# Altium integrated library Altium_WE-VD (rev23a).IntLib: 78 symbols
Pins are listed as number, name and electrical type; pins without a type are passive.

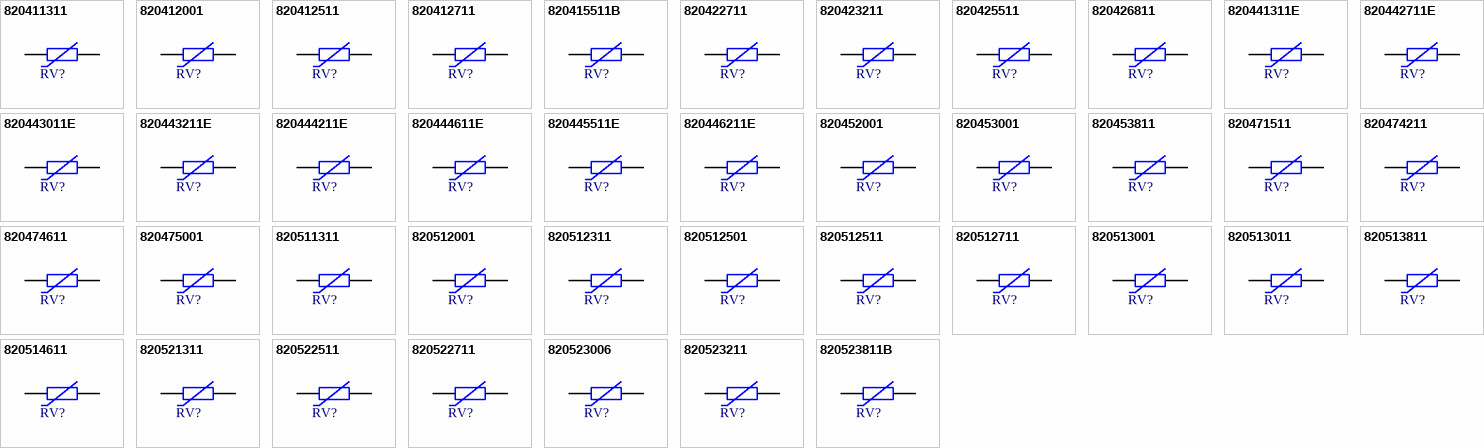
[diagram p0: symbols 820411311 to 820523811B]

## 820411311
designator RV?, comment 130VAC, 170VDC  (value not drawn)
WE-VD Disk Varistor, THT, 130VAC, 170VDC, 410pF; Manufacturer Part Number: 820411311; Manufacturer: Wurth Elektronik; Clamping Voltage: 340V; Energy Absorption: 35J; Operating Voltage (AC): 130V; Operating Voltage (DC): 170V; Pitch: 0.8mm; Power Dissipation: 0.4W; (Reverse) Breakdown Voltage: 200V; (Reverse) Peak Pulse Current: 3500A; Category: Surge Protection; Match Code: WE-VD; ComponentLink1Description: Website Link; ComponentLink1URL: https://www.we-online.com/redexpert/article/820411311?ad; ComponentLink2Description: Datasheet Link; ComponentLink2URL: https://www.we-online.com/redexpert/spec/820411311?ad; Mount: Through Hole; Operating Temperature Max: 85°C; Operating Temperature Min: -40°C; Packaging: Tape and Reel; Width: 4.6mm; Height: 15.5mm; Diameter: 12.5mm; Channel Input Capacitance: 410pF
footprint D12.5W4.6H15.5P0.8
pins: 1, 2

## 820412001
designator RV?, comment 20VAC, 26VDC  (value not drawn)
WE-VD Disk Varistor, THT, 20VAC, 26VDC, 4250pF; Manufacturer Part Number: 820412001; Manufacturer: Wurth Elektronik; Clamping Voltage: 65V; Energy Absorption: 4.8J; Operating Voltage (AC): 20V; Operating Voltage (DC): 26V; Pitch: 0.8mm; Power Dissipation: 0.05W; (Reverse) Breakdown Voltage: 33V; (Reverse) Peak Pulse Current: 1000A; Category: Surge Protection; Match Code: WE-VD; ComponentLink1Description: Website Link; ComponentLink1URL: https://www.we-online.com/redexpert/article/820412001?ad; ComponentLink2Description: Datasheet Link; ComponentLink2URL: https://www.we-online.com/redexpert/spec/820412001?ad; Mount: Through Hole; Operating Temperature Max: 85°C; Operating Temperature Min: -40°C; Packaging: Tape and Reel; Width: 5.1mm; Height: 15.5mm; Diameter: 12.5mm; Channel Input Capacitance: 4250pF
footprint D12.5W5.1H15.5P0.8
pins: 1, 2

## 820412511
designator RV?, comment 250VAC, 320VDC  (value not drawn)
WE-VD Disk Varistor, THT, 250VAC, 320VDC, 210pF; Manufacturer Part Number: 820412511; Manufacturer: Wurth Elektronik; Clamping Voltage: 650V; Energy Absorption: 70J; Operating Voltage (AC): 250V; Operating Voltage (DC): 320V; Pitch: 1.1mm; Power Dissipation: 0.4W; (Reverse) Breakdown Voltage: 390V; (Reverse) Peak Pulse Current: 3500A; Category: Surge Protection; Match Code: WE-VD; ComponentLink1Description: Website Link; ComponentLink1URL: https://www.we-online.com/redexpert/article/820412511?ad; ComponentLink2Description: Datasheet Link; ComponentLink2URL: https://www.we-online.com/redexpert/spec/820412511?ad; Mount: Through Hole; Operating Temperature Max: 85°C; Operating Temperature Min: -40°C; Packaging: Tape and Reel; Width: 5.7mm; Height: 16mm; Diameter: 12.5mm; Channel Input Capacitance: 210pF
footprint D12.5W5.7H16P1.1
pins: 1, 2

## 820412711
designator RV?, comment 275VAC, 350VDC  (value not drawn)
WE-VD Disk Varistor, THT, 275VAC, 350VDC, 190pF; Manufacturer Part Number: 820412711; Manufacturer: Wurth Elektronik; Clamping Voltage: 710V; Energy Absorption: 80J; Operating Voltage (AC): 275V; Operating Voltage (DC): 350V; Pitch: 1.3mm; Power Dissipation: 0.4W; (Reverse) Breakdown Voltage: 430V; (Reverse) Peak Pulse Current: 3500A; Category: Surge Protection; Match Code: WE-VD; ComponentLink1Description: Website Link; ComponentLink1URL: https://www.we-online.com/redexpert/article/820412711?ad; ComponentLink2Description: Datasheet Link; ComponentLink2URL: https://www.we-online.com/redexpert/spec/820412711?ad; Mount: Through Hole; Operating Temperature Max: 85°C; Operating Temperature Min: -40°C; Packaging: Tape and Reel; Width: 6.5mm; Height: 16mm; Diameter: 12.5mm; Channel Input Capacitance: 190pF
footprint D12.5W6.5H16P1.3
pins: 1, 2

## 820415511B
designator RV?, comment 550VAC, 745VDC  (value not drawn)
WE-VD Disk Varistor, THT, 550VAC, 745VDC, 95pF; Manufacturer Part Number: 820415511B; Manufacturer: Wurth Elektronik; Clamping Voltage: 1500V; Energy Absorption: 127J; Operating Voltage (AC): 550V; Operating Voltage (DC): 745V; Pitch: 3.6mm; Power Dissipation: 0.4W; (Reverse) Breakdown Voltage: 910V; (Reverse) Peak Pulse Current: 3500A; Category: Surge Protection; Match Code: WE-VD; ComponentLink1Description: Website Link; ComponentLink1URL: https://www.we-online.com/redexpert/article/820415511B?ad; ComponentLink2Description: Datasheet Link; ComponentLink2URL: https://www.we-online.com/redexpert/spec/820415511B?ad; Mount: Through Hole; Operating Temperature Max: 85°C; Operating Temperature Min: -40°C; Packaging: Tape and Reel; Width: 9.4mm; Height: 16.5mm; Diameter: 12.5mm; Channel Input Capacitance: 95pF
footprint D12.5W9.4H16.5P3.6
pins: 1, 2

## 820422711
designator RV?, comment 275VAC, 350VDC  (value not drawn)
WE-VD Disk Varistor, THT, 275VAC, 350VDC, 860pF; Manufacturer Part Number: 820422711; Manufacturer: Wurth Elektronik; Clamping Voltage: 710V; Energy Absorption: 303J; Operating Voltage (AC): 275V; Operating Voltage (DC): 350V; Pitch: 1.1mm; Power Dissipation: 1W; (Reverse) Breakdown Voltage: 430V; (Reverse) Peak Pulse Current: 10000A; Category: Surge Protection; Match Code: WE-VD; ComponentLink1Description: Website Link; ComponentLink1URL: https://www.we-online.com/redexpert/article/820422711?ad; ComponentLink2Description: Datasheet Link; ComponentLink2URL: https://www.we-online.com/redexpert/spec/820422711?ad; Mount: Through Hole; Operating Temperature Max: 85°C; Operating Temperature Min: -40°C; Packaging: Tape and Reel; Width: 7.2mm; Height: 26.5mm; Diameter: 23mm; Channel Input Capacitance: 860pF
footprint D23W7.2H26.5P1.1
pins: 1, 2

## 820423211
designator RV?, comment 320VAC, 418VDC  (value not drawn)
WE-VD Disk Varistor, THT, 320VAC, 418VDC, 760pF; Manufacturer Part Number: 820423211; Manufacturer: Wurth Elektronik; Clamping Voltage: 842V; Energy Absorption: 382J; Operating Voltage (AC): 320V; Operating Voltage (DC): 418V; Pitch: 1.5mm; Power Dissipation: 1W; (Reverse) Breakdown Voltage: 510V; (Reverse) Peak Pulse Current: 10000A; Category: Surge Protection; Match Code: WE-VD; ComponentLink1Description: Website Link; ComponentLink1URL: https://www.we-online.com/redexpert/article/820423211?ad; ComponentLink2Description: Datasheet Link; ComponentLink2URL: https://www.we-online.com/redexpert/spec/820423211?ad; Mount: Through Hole; Operating Temperature Max: 85°C; Operating Temperature Min: -40°C; Packaging: Tape and Reel; Width: 7.7mm; Height: 27mm; Diameter: 23mm; Channel Input Capacitance: 760pF
footprint D23W7.7H27P1.5
pins: 1, 2

## 820425511
designator RV?, comment 550VAC, 7454VDC  (value not drawn)
WE-VD Disk Varistor, THT, 550VAC, 7454VDC, 430pF; Manufacturer Part Number: 820425511; Manufacturer: Wurth Elektronik; Clamping Voltage: 1500V; Energy Absorption: 510J; Operating Voltage (AC): 550V; Operating Voltage (DC): 7454V; Pitch: 3.4mm; Power Dissipation: 1W; (Reverse) Breakdown Voltage: 910V; (Reverse) Peak Pulse Current: 10000A; Category: Surge Protection; Match Code: WE-VD; ComponentLink1Description: Website Link; ComponentLink1URL: https://www.we-online.com/redexpert/article/820425511?ad; ComponentLink2Description: Datasheet Link; ComponentLink2URL: https://www.we-online.com/redexpert/spec/820425511?ad; Mount: Through Hole; Operating Temperature Max: 85°C; Operating Temperature Min: -40°C; Packaging: Tape and Reel; Width: 10.1mm; Height: 27mm; Diameter: 23mm; Channel Input Capacitance: 430pF
footprint D23W10.1H27P3.4
pins: 1, 2

## 820426811
designator RV?, comment 680VAC, 895VDC  (value not drawn)
WE-VD Disk Varistor, THT, 680VAC, 895VDC, 360pF; Manufacturer Part Number: 820426811; Manufacturer: Wurth Elektronik; Clamping Voltage: 1815V; Energy Absorption: 620J; Operating Voltage (AC): 680V; Operating Voltage (DC): 895V; Pitch: 4.3mm; Power Dissipation: 1W; (Reverse) Breakdown Voltage: 1100V; (Reverse) Peak Pulse Current: 10000A; Category: Surge Protection; Match Code: WE-VD; ComponentLink1Description: Website Link; ComponentLink1URL: https://www.we-online.com/redexpert/article/820426811?ad; ComponentLink2Description: Datasheet Link; ComponentLink2URL: https://www.we-online.com/redexpert/spec/820426811?ad; Mount: Through Hole; Operating Temperature Max: 85°C; Operating Temperature Min: -40°C; Packaging: Tape and Reel; Width: 11.2mm; Height: 27mm; Diameter: 23mm; Channel Input Capacitance: 360pF
footprint D23W11.2H27P4.3
pins: 1, 2

## 820441311E
designator RV?, comment 130VAC, 170VDC  (value not drawn)
WE-VD Disk Varistor, THT, 130VAC, 170VDC, 840pF; Manufacturer Part Number: 820441311E; Manufacturer: Wurth Elektronik; Clamping Voltage: 340V; Energy Absorption: 70J; Operating Voltage (AC): 130V; Operating Voltage (DC): 170V; Pitch: 0.8mm; Power Dissipation: 0.6W; (Reverse) Breakdown Voltage: 200V; (Reverse) Peak Pulse Current: 6000A; Category: Surge Protection; Match Code: WE-VD; ComponentLink1Description: Website Link; ComponentLink1URL: https://www.we-online.com/redexpert/article/820441311E?ad; ComponentLink2Description: Datasheet Link; ComponentLink2URL: https://www.we-online.com/redexpert/spec/820441311E?ad; Mount: Through Hole; Operating Temperature Max: 85°C; Operating Temperature Min: -40°C; Packaging: Tape and Reel; Width: 4.8mm; Height: 19.5mm; Diameter: 16.5mm; Channel Input Capacitance: 840pF
footprint D16.5W4.8H19.5P0.8
pins: 1, 2

## 820442711E
designator RV?, comment 275VAC, 350VDC  (value not drawn)
WE-VD Disk Varistor, THT, 275VAC, 350VDC, 450pF; Manufacturer Part Number: 820442711E; Manufacturer: Wurth Elektronik; Clamping Voltage: 710V; Energy Absorption: 155J; Operating Voltage (AC): 275V; Operating Voltage (DC): 350V; Pitch: 1.3mm; Power Dissipation: 0.6W; (Reverse) Breakdown Voltage: 430V; (Reverse) Peak Pulse Current: 6000A; Category: Surge Protection; Match Code: WE-VD; ComponentLink1Description: Website Link; ComponentLink1URL: https://www.we-online.com/redexpert/article/820442711E?ad; ComponentLink2Description: Datasheet Link; ComponentLink2URL: https://www.we-online.com/redexpert/spec/820442711E?ad; Mount: Through Hole; Operating Temperature Max: 85°C; Operating Temperature Min: -40°C; Packaging: Tape and Reel; Width: 6.7mm; Height: 20mm; Diameter: 16.5mm; Channel Input Capacitance: 450pF
footprint D16.5W6.7H20P1.3
pins: 1, 2

## 820443011E
designator RV?, comment 300VAC, 385VDC  (value not drawn)
WE-VD Disk Varistor, THT, 300VAC, 385VDC, 420pF; Manufacturer Part Number: 820443011E; Manufacturer: Wurth Elektronik; Clamping Voltage: 775V; Energy Absorption: 175J; Operating Voltage (AC): 300V; Operating Voltage (DC): 385V; Pitch: 1.5mm; Power Dissipation: 0.6W; (Reverse) Breakdown Voltage: 470V; (Reverse) Peak Pulse Current: 6000A; Category: Surge Protection; Match Code: WE-VD; ComponentLink1Description: Website Link; ComponentLink1URL: https://www.we-online.com/redexpert/article/820443011E?ad; ComponentLink2Description: Datasheet Link; ComponentLink2URL: https://www.we-online.com/redexpert/spec/820443011E?ad; Mount: Through Hole; Operating Temperature Max: 85°C; Operating Temperature Min: -40°C; Packaging: Tape and Reel; Width: 7mm; Height: 20mm; Diameter: 16.5mm; Channel Input Capacitance: 420pF
footprint D16.5W7H20P1.5
pins: 1, 2

## 820443211E
designator RV?, comment 320VAC, 418VDC  (value not drawn)
WE-VD Disk Varistor, THT, 320VAC, 418VDC, 370pF; Manufacturer Part Number: 820443211E; Manufacturer: Wurth Elektronik; Clamping Voltage: 842V; Energy Absorption: 190J; Operating Voltage (AC): 320V; Operating Voltage (DC): 418V; Pitch: 1.6mm; Power Dissipation: 0.6W; (Reverse) Breakdown Voltage: 510V; (Reverse) Peak Pulse Current: 6000A; Category: Surge Protection; Match Code: WE-VD; ComponentLink1Description: Website Link; ComponentLink1URL: https://www.we-online.com/redexpert/article/820443211E?ad; ComponentLink2Description: Datasheet Link; ComponentLink2URL: https://www.we-online.com/redexpert/spec/820443211E?ad; Mount: Through Hole; Operating Temperature Max: 85°C; Operating Temperature Min: -40°C; Packaging: Tape and Reel; Width: 7.2mm; Height: 20.5mm; Diameter: 16.5mm; Channel Input Capacitance: 370pF
footprint D16.5W7.2H20.5P1.6
pins: 1, 2

## 820444211E
designator RV?, comment 420VAC, 560VDC  (value not drawn)
WE-VD Disk Varistor, THT, 420VAC, 560VDC, 290pF; Manufacturer Part Number: 820444211E; Manufacturer: Wurth Elektronik; Clamping Voltage: 1120V; Energy Absorption: 225J; Operating Voltage (AC): 420V; Operating Voltage (DC): 560V; Pitch: 2.5mm; Power Dissipation: 0.6W; (Reverse) Breakdown Voltage: 680V; (Reverse) Peak Pulse Current: 6000A; Category: Surge Protection; Match Code: WE-VD; ComponentLink1Description: Website Link; ComponentLink1URL: https://www.we-online.com/redexpert/article/820444211E?ad; ComponentLink2Description: Datasheet Link; ComponentLink2URL: https://www.we-online.com/redexpert/spec/820444211E?ad; Mount: Through Hole; Operating Temperature Max: 85°C; Operating Temperature Min: -40°C; Packaging: Tape and Reel; Width: 8.2mm; Height: 20.5mm; Diameter: 16.5mm; Channel Input Capacitance: 290pF
footprint D16.5W8.2H20.5P2.5
pins: 1, 2

## 820444611E
designator RV?, comment 460VAC, 615VDC  (value not drawn)
WE-VD Disk Varistor, THT, 460VAC, 615VDC, 270pF; Manufacturer Part Number: 820444611E; Manufacturer: Wurth Elektronik; Clamping Voltage: 1240V; Energy Absorption: 230J; Operating Voltage (AC): 460V; Operating Voltage (DC): 615V; Pitch: 2.8mm; Power Dissipation: 0.6W; (Reverse) Breakdown Voltage: 750V; (Reverse) Peak Pulse Current: 6000A; Category: Surge Protection; Match Code: WE-VD; ComponentLink1Description: Website Link; ComponentLink1URL: https://www.we-online.com/redexpert/article/820444611E?ad; ComponentLink2Description: Datasheet Link; ComponentLink2URL: https://www.we-online.com/redexpert/spec/820444611E?ad; Mount: Through Hole; Operating Temperature Max: 85°C; Operating Temperature Min: -40°C; Packaging: Tape and Reel; Width: 8.6mm; Height: 20.5mm; Diameter: 16.5mm; Channel Input Capacitance: 270pF
footprint D16.5W8.6H20.5P2.8
pins: 1, 2

## 820445511E
designator RV?, comment 550VAC, 745VDC  (value not drawn)
WE-VD Disk Varistor, THT, 550VAC, 745VDC, 240pF; Manufacturer Part Number: 820445511E; Manufacturer: Wurth Elektronik; Clamping Voltage: 1500V; Energy Absorption: 255J; Operating Voltage (AC): 550V; Operating Voltage (DC): 745V; Pitch: 3.6mm; Power Dissipation: 0.6W; (Reverse) Breakdown Voltage: 910V; (Reverse) Peak Pulse Current: 6000A; Category: Surge Protection; Match Code: WE-VD; ComponentLink1Description: Website Link; ComponentLink1URL: https://www.we-online.com/redexpert/article/820445511E?ad; ComponentLink2Description: Datasheet Link; ComponentLink2URL: https://www.we-online.com/redexpert/spec/820445511E?ad; Mount: Through Hole; Operating Temperature Max: 85°C; Operating Temperature Min: -40°C; Packaging: Tape and Reel; Width: 9.6mm; Height: 20.5mm; Diameter: 16.5mm; Channel Input Capacitance: 240pF
footprint D16.5W9.6H20.5P3.6
pins: 1, 2

## 820446211E
designator RV?, comment 625VAC, 825VDC  (value not drawn)
WE-VD Disk Varistor, THT, 625VAC, 825VDC, 200pF; Manufacturer Part Number: 820446211E; Manufacturer: Wurth Elektronik; Clamping Voltage: 1650V; Energy Absorption: 283J; Operating Voltage (AC): 625V; Operating Voltage (DC): 825V; Pitch: 4mm; Power Dissipation: 0.6W; (Reverse) Breakdown Voltage: 1000V; (Reverse) Peak Pulse Current: 6000A; Category: Surge Protection; Match Code: WE-VD; ComponentLink1Description: Website Link; ComponentLink1URL: https://www.we-online.com/redexpert/article/820446211E?ad; ComponentLink2Description: Datasheet Link; ComponentLink2URL: https://www.we-online.com/redexpert/spec/820446211E?ad; Mount: Through Hole; Operating Temperature Max: 85°C; Operating Temperature Min: -40°C; Packaging: Tape and Reel; Width: 10.1mm; Height: 20.5mm; Diameter: 16.5mm; Channel Input Capacitance: 200pF
footprint D16.5W10.1H20.5P4
pins: 1, 2

## 820452001
designator RV?, comment 20VAC, 26VDC  (value not drawn)
WE-VD Disk Varistor, THT, 20VAC, 26VDC, 880pF; Manufacturer Part Number: 820452001; Manufacturer: Wurth Elektronik; Clamping Voltage: 73V; Energy Absorption: 1.3J; Operating Voltage (AC): 20V; Operating Voltage (DC): 26V; Pitch: 0.8mm; Power Dissipation: 0.01W; (Reverse) Breakdown Voltage: 33V; (Reverse) Peak Pulse Current: 250A; Category: Surge Protection; Match Code: WE-VD; ComponentLink1Description: Website Link; ComponentLink1URL: https://www.we-online.com/redexpert/article/820452001?ad; ComponentLink2Description: Datasheet Link; ComponentLink2URL: https://www.we-online.com/redexpert/spec/820452001?ad; Mount: Through Hole; Operating Temperature Max: 85°C; Operating Temperature Min: -40°C; Packaging: Tape and Reel; Width: 4.7mm; Height: 10.5mm; Diameter: 7.5mm; Channel Input Capacitance: 880pF
footprint D7.5W4.7H10.5P0.8
pins: 1, 2

## 820453001
designator RV?, comment 30VAC, 38VDC  (value not drawn)
WE-VD Disk Varistor, THT, 30VAC, 38VDC, 720pF; Manufacturer Part Number: 820453001; Manufacturer: Wurth Elektronik; Clamping Voltage: 104V; Energy Absorption: 1.8J; Operating Voltage (AC): 30V; Operating Voltage (DC): 38V; Pitch: 0.8mm; Power Dissipation: 0.01W; (Reverse) Breakdown Voltage: 47V; (Reverse) Peak Pulse Current: 250A; Category: Surge Protection; Match Code: WE-VD; ComponentLink1Description: Website Link; ComponentLink1URL: https://www.we-online.com/redexpert/article/820453001?ad; ComponentLink2Description: Datasheet Link; ComponentLink2URL: https://www.we-online.com/redexpert/spec/820453001?ad; Mount: Through Hole; Operating Temperature Max: 85°C; Operating Temperature Min: -40°C; Packaging: Tape and Reel; Width: 5mm; Height: 10.5mm; Diameter: 7.5mm; Channel Input Capacitance: 720pF
footprint D7.5W5H10.5P0.8
pins: 1, 2

## 820453811
designator RV?, comment 385VAC, 505VDC  (value not drawn)
WE-VD Disk Varistor, THT, 385VAC, 505VDC, 45pF; Manufacturer Part Number: 820453811; Manufacturer: Wurth Elektronik; Clamping Voltage: 1050V; Energy Absorption: 27J; Operating Voltage (AC): 385V; Operating Voltage (DC): 505V; Pitch: 2.4mm; Power Dissipation: 0.1W; (Reverse) Breakdown Voltage: 620V; (Reverse) Peak Pulse Current: 800A; Category: Surge Protection; Match Code: WE-VD; ComponentLink1Description: Website Link; ComponentLink1URL: https://www.we-online.com/redexpert/article/820453811?ad; ComponentLink2Description: Datasheet Link; ComponentLink2URL: https://www.we-online.com/redexpert/spec/820453811?ad; Mount: Through Hole; Operating Temperature Max: 85°C; Operating Temperature Min: -40°C; Packaging: Tape and Reel; Width: 7.2mm; Height: 11.5mm; Diameter: 7.5mm; Channel Input Capacitance: 45pF
footprint D7.5W7.2H11.5P2.4
pins: 1, 2

## 820471511
designator RV?, comment 150VAC, 200VDC  (value not drawn)
WE-VD Disk Varistor, THT, 150VAC, 200VDC, 180pF; Manufacturer Part Number: 820471511; Manufacturer: Wurth Elektronik; Clamping Voltage: 395V; Energy Absorption: 21J; Operating Voltage (AC): 150V; Operating Voltage (DC): 200V; Pitch: 0.8mm; Power Dissipation: 0.25W; (Reverse) Breakdown Voltage: 240V; (Reverse) Peak Pulse Current: 1750A; Category: Surge Protection; Match Code: WE-VD; ComponentLink1Description: Website Link; ComponentLink1URL: https://www.we-online.com/redexpert/article/820471511?ad; ComponentLink2Description: Datasheet Link; ComponentLink2URL: https://www.we-online.com/redexpert/spec/820471511?ad; Mount: Through Hole; Operating Temperature Max: 85°C; Operating Temperature Min: -40°C; Packaging: Tape and Reel; Width: 4.4mm; Height: 12mm; Diameter: 9mm; Channel Input Capacitance: 180pF
footprint D9W4.4H12P0.8
pins: 1, 2

## 820474211
designator RV?, comment 420VAC, 560VDC  (value not drawn)
WE-VD Disk Varistor, THT, 420VAC, 560VDC, 78pF; Manufacturer Part Number: 820474211; Manufacturer: Wurth Elektronik; Clamping Voltage: 1120V; Energy Absorption: 56J; Operating Voltage (AC): 420V; Operating Voltage (DC): 560V; Pitch: 2.7mm; Power Dissipation: 0.25W; (Reverse) Breakdown Voltage: 680V; (Reverse) Peak Pulse Current: 1750A; Category: Surge Protection; Match Code: WE-VD; ComponentLink1Description: Website Link; ComponentLink1URL: https://www.we-online.com/redexpert/article/820474211?ad; ComponentLink2Description: Datasheet Link; ComponentLink2URL: https://www.we-online.com/redexpert/spec/820474211?ad; Mount: Through Hole; Operating Temperature Max: 85°C; Operating Temperature Min: -40°C; Packaging: Tape and Reel; Width: 7.5mm; Height: 13mm; Diameter: 9mm; Channel Input Capacitance: 78pF
footprint D9W7.5H13P2.7
pins: 1, 2

## 820474611
designator RV?, comment 460VAC, 615VDC  (value not drawn)
WE-VD Disk Varistor, THT, 460VAC, 615VDC, 75pF; Manufacturer Part Number: 820474611; Manufacturer: Wurth Elektronik; Clamping Voltage: 1240V; Energy Absorption: 58J; Operating Voltage (AC): 460V; Operating Voltage (DC): 615V; Pitch: 3mm; Power Dissipation: 0.25W; (Reverse) Breakdown Voltage: 750V; (Reverse) Peak Pulse Current: 1750A; Category: Surge Protection; Match Code: WE-VD; ComponentLink1Description: Website Link; ComponentLink1URL: https://www.we-online.com/redexpert/article/820474611?ad; ComponentLink2Description: Datasheet Link; ComponentLink2URL: https://www.we-online.com/redexpert/spec/820474611?ad; Mount: Through Hole; Operating Temperature Max: 85°C; Operating Temperature Min: -40°C; Packaging: Tape and Reel; Width: 7.9mm; Height: 13mm; Diameter: 9mm; Channel Input Capacitance: 75pF
footprint D9W7.9H13P3
pins: 1, 2

## 820475001
designator RV?, comment 50VAC, 65VDC  (value not drawn)
WE-VD Disk Varistor, THT, 50VAC, 65VDC, 640pF; Manufacturer Part Number: 820475001; Manufacturer: Wurth Elektronik; Clamping Voltage: 135V; Energy Absorption: 7J; Operating Voltage (AC): 50V; Operating Voltage (DC): 65V; Pitch: 0.8mm; Power Dissipation: 0.25W; (Reverse) Breakdown Voltage: 82V; (Reverse) Peak Pulse Current: 1750A; Category: Surge Protection; Match Code: WE-VD; ComponentLink1Description: Website Link; ComponentLink1URL: https://www.we-online.com/redexpert/article/820475001?ad; ComponentLink2Description: Datasheet Link; ComponentLink2URL: https://www.we-online.com/redexpert/spec/820475001?ad; Mount: Through Hole; Operating Temperature Max: 85°C; Operating Temperature Min: -40°C; Packaging: Tape and Reel; Width: 3.8mm; Height: 12mm; Diameter: 9mm; Channel Input Capacitance: 640pF
footprint D9W3.8H12P0.8
pins: 1, 2

## 820511311
designator RV?, comment 130VAC, 170VDC  (value not drawn)
WE-VD Disk Varistor, THT, 130VAC, 170VDC, 410pF; Manufacturer Part Number: 820511311; Manufacturer: Wurth Elektronik; Clamping Voltage: 340V; Energy Absorption: 28.5J; Operating Voltage (AC): 130V; Operating Voltage (DC): 170V; Pitch: 0.8mm; Power Dissipation: 0.4W; (Reverse) Breakdown Voltage: 200V; (Reverse) Peak Pulse Current: 2500A; Category: Surge Protection; Match Code: WE-VD; ComponentLink1Description: Website Link; ComponentLink1URL: https://www.we-online.com/redexpert/article/820511311?ad; ComponentLink2Description: Datasheet Link; ComponentLink2URL: https://www.we-online.com/redexpert/spec/820511311?ad; Mount: Through Hole; Operating Temperature Max: 85°C; Operating Temperature Min: -40°C; Packaging: Tape and Reel; Width: 4.6mm; Height: 15.5mm; Diameter: 12.5mm; Channel Input Capacitance: 410pF
footprint D12.5W4.6H15.5P0.8
pins: 1, 2

## 820512001
designator RV?, comment 20VAC, 26VDC  (value not drawn)
WE-VD Disk Varistor, THT, 20VAC, 26VDC, 4250pF; Manufacturer Part Number: 820512001; Manufacturer: Wurth Elektronik; Clamping Voltage: 65V; Energy Absorption: 4.4J; Operating Voltage (AC): 20V; Operating Voltage (DC): 26V; Pitch: 0.8mm; Power Dissipation: 0.05W; (Reverse) Breakdown Voltage: 33V; (Reverse) Peak Pulse Current: 500A; Category: Surge Protection; Match Code: WE-VD; ComponentLink1Description: Website Link; ComponentLink1URL: https://www.we-online.com/redexpert/article/820512001?ad; ComponentLink2Description: Datasheet Link; ComponentLink2URL: https://www.we-online.com/redexpert/spec/820512001?ad; Mount: Through Hole; Operating Temperature Max: 85°C; Operating Temperature Min: -40°C; Packaging: Tape and Reel; Width: 5.1mm; Height: 15.5mm; Diameter: 12.5mm; Channel Input Capacitance: 4250pF
footprint D12.5W5.1H15.5P0.8
pins: 1, 2

## 820512311
designator RV?, comment 230VAC, 300VDC  (value not drawn)
WE-VD Disk Varistor, THT, 230VAC, 300VDC, 230pF; Manufacturer Part Number: 820512311; Manufacturer: Wurth Elektronik; Clamping Voltage: 595V; Energy Absorption: 52J; Operating Voltage (AC): 230V; Operating Voltage (DC): 300V; Pitch: 0.9mm; Power Dissipation: 0.4W; (Reverse) Breakdown Voltage: 360V; (Reverse) Peak Pulse Current: 2500A; Category: Surge Protection; Match Code: WE-VD; ComponentLink1Description: Website Link; ComponentLink1URL: https://www.we-online.com/redexpert/article/820512311?ad; ComponentLink2Description: Datasheet Link; ComponentLink2URL: https://www.we-online.com/redexpert/spec/820512311?ad; Mount: Through Hole; Operating Temperature Max: 85°C; Operating Temperature Min: -40°C; Packaging: Tape and Reel; Width: 5.5mm; Height: 15.5mm; Diameter: 12.5mm; Channel Input Capacitance: 230pF
footprint D12.5W5.5H15.5P0.9
pins: 1, 2

## 820512501
designator RV?, comment 25VAC, 31VDC  (value not drawn)
WE-VD Disk Varistor, THT, 25VAC, 31VDC, 3660pF; Manufacturer Part Number: 820512501; Manufacturer: Wurth Elektronik; Clamping Voltage: 77V; Energy Absorption: 4.7J; Operating Voltage (AC): 25V; Operating Voltage (DC): 31V; Pitch: 0.8mm; Power Dissipation: 0.05W; (Reverse) Breakdown Voltage: 39V; (Reverse) Peak Pulse Current: 500A; Category: Surge Protection; Match Code: WE-VD; ComponentLink1Description: Website Link; ComponentLink1URL: https://www.we-online.com/redexpert/article/820512501?ad; ComponentLink2Description: Datasheet Link; ComponentLink2URL: https://www.we-online.com/redexpert/spec/820512501?ad; Mount: Through Hole; Operating Temperature Max: 85°C; Operating Temperature Min: -40°C; Packaging: Tape and Reel; Width: 5.1mm; Height: 15.5mm; Diameter: 12.5mm; Channel Input Capacitance: 3660pF
footprint D12.5W5.1H15.5P0.8
pins: 1, 2

## 820512511
designator RV?, comment 250VAC, 320VDC  (value not drawn)
WE-VD Disk Varistor, THT, 250VAC, 320VDC, 210pF; Manufacturer Part Number: 820512511; Manufacturer: Wurth Elektronik; Clamping Voltage: 650V; Energy Absorption: 60J; Operating Voltage (AC): 250V; Operating Voltage (DC): 320V; Pitch: 1.1mm; Power Dissipation: 0.4W; (Reverse) Breakdown Voltage: 390V; (Reverse) Peak Pulse Current: 2500A; Category: Surge Protection; Match Code: WE-VD; ComponentLink1Description: Website Link; ComponentLink1URL: https://www.we-online.com/redexpert/article/820512511?ad; ComponentLink2Description: Datasheet Link; ComponentLink2URL: https://www.we-online.com/redexpert/spec/820512511?ad; Mount: Through Hole; Operating Temperature Max: 85°C; Operating Temperature Min: -40°C; Packaging: Tape and Reel; Width: 5.7mm; Height: 16mm; Diameter: 12.5mm; Channel Input Capacitance: 210pF
footprint D12.5W5.7H16P1.1
pins: 1, 2

## 820512711
designator RV?, comment 275VAC, 350VDC  (value not drawn)
WE-VD Disk Varistor, THT, 275VAC, 350VDC, 190pF; Manufacturer Part Number: 820512711; Manufacturer: Wurth Elektronik; Clamping Voltage: 710V; Energy Absorption: 66J; Operating Voltage (AC): 275V; Operating Voltage (DC): 350V; Pitch: 1.3mm; Power Dissipation: 0.4W; (Reverse) Breakdown Voltage: 430V; (Reverse) Peak Pulse Current: 2500A; Category: Surge Protection; Match Code: WE-VD; ComponentLink1Description: Website Link; ComponentLink1URL: https://www.we-online.com/redexpert/article/820512711?ad; ComponentLink2Description: Datasheet Link; ComponentLink2URL: https://www.we-online.com/redexpert/spec/820512711?ad; Mount: Through Hole; Operating Temperature Max: 85°C; Operating Temperature Min: -40°C; Packaging: Tape and Reel; Width: 6.5mm; Height: 16mm; Diameter: 12.5mm; Channel Input Capacitance: 190pF
footprint D12.5W6.5H16P1.3
pins: 1, 2

## 820513001
designator RV?, comment 30VAC, 38VDC  (value not drawn)
WE-VD Disk Varistor, THT, 30VAC, 38VDC, 3140pF; Manufacturer Part Number: 820513001; Manufacturer: Wurth Elektronik; Clamping Voltage: 93V; Energy Absorption: 6J; Operating Voltage (AC): 30V; Operating Voltage (DC): 38V; Pitch: 0.8mm; Power Dissipation: 0.05W; (Reverse) Breakdown Voltage: 47V; (Reverse) Peak Pulse Current: 500A; Category: Surge Protection; Match Code: WE-VD; ComponentLink1Description: Website Link; ComponentLink1URL: https://www.we-online.com/redexpert/article/820513001?ad; ComponentLink2Description: Datasheet Link; ComponentLink2URL: https://www.we-online.com/redexpert/spec/820513001?ad; Mount: Through Hole; Operating Temperature Max: 85°C; Operating Temperature Min: -40°C; Packaging: Tape and Reel; Width: 5.5mm; Height: 15.5mm; Diameter: 12.5mm; Channel Input Capacitance: 3140pF
footprint D12.5W5.5H15.5P0.8
pins: 1, 2

## 820513011
designator RV?, comment 300VAC, 385VDC  (value not drawn)
WE-VD Disk Varistor, THT, 300VAC, 385VDC, 190pF; Manufacturer Part Number: 820513011; Manufacturer: Wurth Elektronik; Clamping Voltage: 775V; Energy Absorption: 70J; Operating Voltage (AC): 300V; Operating Voltage (DC): 385V; Pitch: 1.5mm; Power Dissipation: 0.4W; (Reverse) Breakdown Voltage: 470V; (Reverse) Peak Pulse Current: 2500A; Category: Surge Protection; Match Code: WE-VD; ComponentLink1Description: Website Link; ComponentLink1URL: https://www.we-online.com/redexpert/article/820513011?ad; ComponentLink2Description: Datasheet Link; ComponentLink2URL: https://www.we-online.com/redexpert/spec/820513011?ad; Mount: Through Hole; Operating Temperature Max: 85°C; Operating Temperature Min: -40°C; Packaging: Tape and Reel; Width: 6.8mm; Height: 16mm; Diameter: 12.5mm; Channel Input Capacitance: 190pF
footprint D12.5W6.8H16P1.5
pins: 1, 2

## 820513811
designator RV?, comment 385VAC, 505VDC  (value not drawn)
WE-VD Disk Varistor, THT, 385VAC, 505VDC, 160pF; Manufacturer Part Number: 820513811; Manufacturer: Wurth Elektronik; Clamping Voltage: 1025V; Energy Absorption: 82J; Operating Voltage (AC): 385V; Operating Voltage (DC): 505V; Pitch: 2.2mm; Power Dissipation: 0.4W; (Reverse) Breakdown Voltage: 620V; (Reverse) Peak Pulse Current: 2500A; Category: Surge Protection; Match Code: WE-VD; ComponentLink1Description: Website Link; ComponentLink1URL: https://www.we-online.com/redexpert/article/820513811?ad; ComponentLink2Description: Datasheet Link; ComponentLink2URL: https://www.we-online.com/redexpert/spec/820513811?ad; Mount: Through Hole; Operating Temperature Max: 85°C; Operating Temperature Min: -40°C; Packaging: Tape and Reel; Width: 7.6mm; Height: 16.5mm; Diameter: 12.5mm; Channel Input Capacitance: 160pF
footprint D12.5W7.6H16.5P2.2
pins: 1, 2

## 820514611
designator RV?, comment 460VAC, 615VDC  (value not drawn)
WE-VD Disk Varistor, THT, 460VAC, 615VDC, 140pF; Manufacturer Part Number: 820514611; Manufacturer: Wurth Elektronik; Clamping Voltage: 1240V; Energy Absorption: 90J; Operating Voltage (AC): 460V; Operating Voltage (DC): 615V; Pitch: 2.8mm; Power Dissipation: 0.4W; (Reverse) Breakdown Voltage: 750V; (Reverse) Peak Pulse Current: 2500A; Category: Surge Protection; Match Code: WE-VD; ComponentLink1Description: Website Link; ComponentLink1URL: https://www.we-online.com/redexpert/article/820514611?ad; ComponentLink2Description: Datasheet Link; ComponentLink2URL: https://www.we-online.com/redexpert/spec/820514611?ad; Mount: Through Hole; Operating Temperature Max: 85°C; Operating Temperature Min: -40°C; Packaging: Tape and Reel; Width: 8.4mm; Height: 16.5mm; Diameter: 12.5mm; Channel Input Capacitance: 140pF
footprint D12.5W8.4H16.5P2.8
pins: 1, 2

## 820521311
designator RV?, comment 130VAC, 170VDC  (value not drawn)
WE-VD Disk Varistor, THT, 130VAC, 170VDC, 1830pF; Manufacturer Part Number: 820521311; Manufacturer: Wurth Elektronik; Clamping Voltage: 340V; Energy Absorption: 114J; Operating Voltage (AC): 130V; Operating Voltage (DC): 170V; Pitch: 0.8mm; Power Dissipation: 1W; (Reverse) Breakdown Voltage: 200V; (Reverse) Peak Pulse Current: 6500A; Category: Surge Protection; Match Code: WE-VD; ComponentLink1Description: Website Link; ComponentLink1URL: https://www.we-online.com/redexpert/article/820521311?ad; ComponentLink2Description: Datasheet Link; ComponentLink2URL: https://www.we-online.com/redexpert/spec/820521311?ad; Mount: Through Hole; Operating Temperature Max: 85°C; Operating Temperature Min: -40°C; Packaging: Tape and Reel; Width: 5.3mm; Height: 26.5mm; Diameter: 23mm; Channel Input Capacitance: 1830pF
footprint D23W5.3H26.5P0.8
pins: 1, 2

## 820522511
designator RV?, comment 250VAC, 320VDC  (value not drawn)
WE-VD Disk Varistor, THT, 250VAC, 320VDC, 980pF; Manufacturer Part Number: 820522511; Manufacturer: Wurth Elektronik; Clamping Voltage: 650V; Energy Absorption: 240J; Operating Voltage (AC): 250V; Operating Voltage (DC): 320V; Pitch: 0.9mm; Power Dissipation: 1W; (Reverse) Breakdown Voltage: 390V; (Reverse) Peak Pulse Current: 6500A; Category: Surge Protection; Match Code: WE-VD; ComponentLink1Description: Website Link; ComponentLink1URL: https://www.we-online.com/redexpert/article/820522511?ad; ComponentLink2Description: Datasheet Link; ComponentLink2URL: https://www.we-online.com/redexpert/spec/820522511?ad; Mount: Through Hole; Operating Temperature Max: 85°C; Operating Temperature Min: -40°C; Packaging: Tape and Reel; Width: 6.4mm; Height: 26.5mm; Diameter: 23mm; Channel Input Capacitance: 980pF
footprint D23W6.4H26.5P0.9
pins: 1, 2

## 820522711
designator RV?, comment 275VAC, 350VDC  (value not drawn)
WE-VD Disk Varistor, THT, 275VAC, 350VDC, 860pF; Manufacturer Part Number: 820522711; Manufacturer: Wurth Elektronik; Clamping Voltage: 710V; Energy Absorption: 264J; Operating Voltage (AC): 275V; Operating Voltage (DC): 350V; Pitch: 1.1mm; Power Dissipation: 1W; (Reverse) Breakdown Voltage: 430V; (Reverse) Peak Pulse Current: 6500A; Category: Surge Protection; Match Code: WE-VD; ComponentLink1Description: Website Link; ComponentLink1URL: https://www.we-online.com/redexpert/article/820522711?ad; ComponentLink2Description: Datasheet Link; ComponentLink2URL: https://www.we-online.com/redexpert/spec/820522711?ad; Mount: Through Hole; Operating Temperature Max: 85°C; Operating Temperature Min: -40°C; Packaging: Tape and Reel; Width: 7.2mm; Height: 26.5mm; Diameter: 23mm; Channel Input Capacitance: 860pF
footprint D23W7.2H26.5P1.1
pins: 1, 2

## 820523006
designator RV?, comment 30VAC, 38VDC  (value not drawn)
WE-VD Disk Varistor, THT, 30VAC, 38VDC, 12100pF; Manufacturer Part Number: 820523006; Manufacturer: Wurth Elektronik; Clamping Voltage: 93V; Energy Absorption: 17J; Operating Voltage (AC): 30V; Operating Voltage (DC): 38V; Pitch: 0.8mm; Power Dissipation: 0.2W; (Reverse) Breakdown Voltage: 47V; (Reverse) Peak Pulse Current: 2000A; Category: Surge Protection; Match Code: WE-VD; ComponentLink1Description: Website Link; ComponentLink1URL: https://www.we-online.com/redexpert/article/820523006?ad; ComponentLink2Description: Datasheet Link; ComponentLink2URL: https://www.we-online.com/redexpert/spec/820523006?ad; Mount: Through Hole; Operating Temperature Max: 85°C; Operating Temperature Min: -40°C; Packaging: Tape and Reel; Width: 5.6mm; Height: 26.5mm; Diameter: 23mm; Channel Input Capacitance: 12100pF
footprint D23W5.6H26.5P0.8
pins: 1, 2
